# Altium footprint library Intelliclone.PcbLib: 372 footprints (part 6 of 24)
Each footprint in its own frame and in the unit in brackets; x right, y up, seen from the top. Pads: shape width x height; smd on the part's side, far side on the other; paste and mask are expansions set on the pad; w line width, h text height; cw(c..) or ccw(c..) is an arc to the next point about the centre after c.
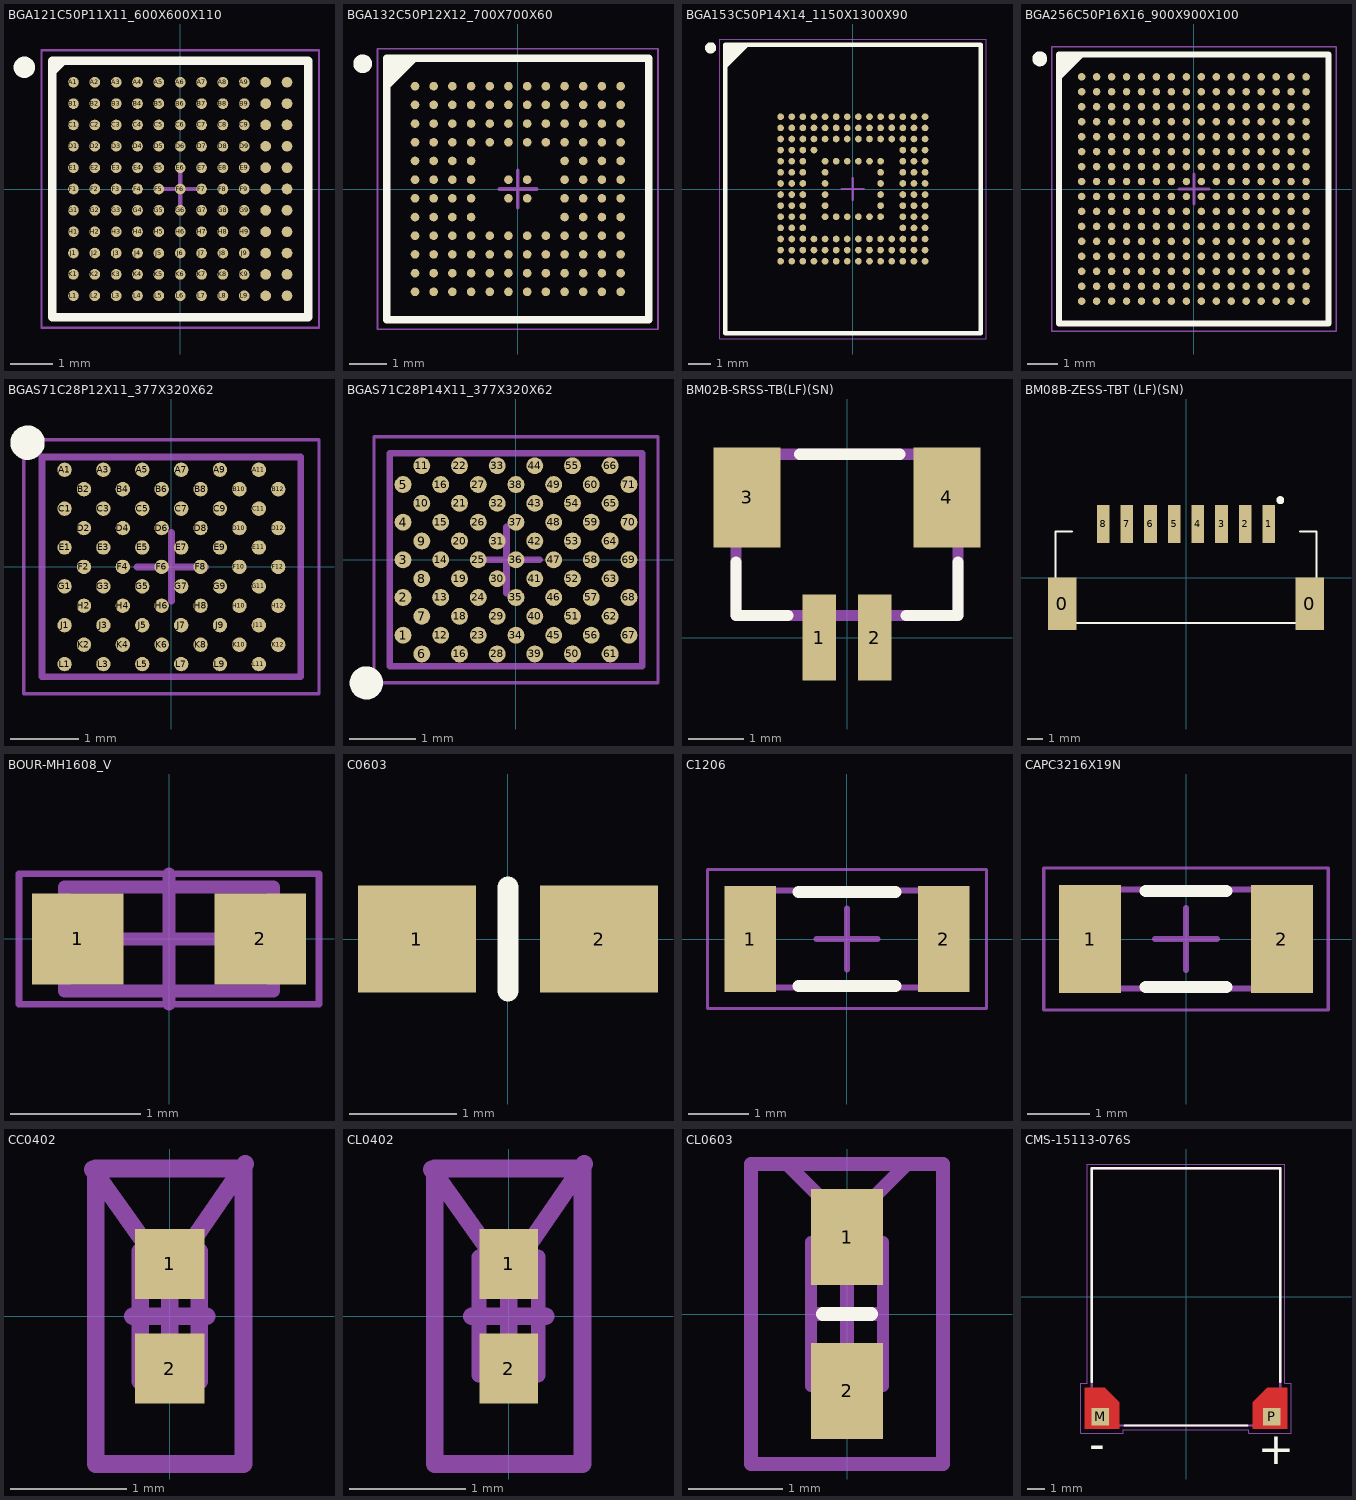
[diagram p5: the footprints below, top view; thin cyan lines are the x and y axes]

## BGA121C50P11X11_600X600X110 [mm] "BGA, 121-Leads, Body 6.00x6.00mmx1.10mm, Pitch 0.50mm"
height 1.1
pads (121):
  round 0.25 smd: A1(-2.5,2.5) A2(-2,2.5) A3(-1.5,2.5) A4(-1,2.5) A5(-0.5,2.5) A6(0,2.5) A7(0.5,2.5) A8(1,2.5) A9(1.5,2.5) A10(2,2.5) A11(2.5,2.5) B1(-2.5,2) B2(-2,2) B3(-1.5,2) B4(-1,2) B5(-0.5,2) B6(0,2) B7(0.5,2) B8(1,2) B9(1.5,2) B10(2,2) B11(2.5,2) C1(-2.5,1.5) C2(-2,1.5) C3(-1.5,1.5) C4(-1,1.5) C5(-0.5,1.5) C6(0,1.5) C7(0.5,1.5) C8(1,1.5) C9(1.5,1.5) C10(2,1.5) C11(2.5,1.5) D1(-2.5,1) D2(-2,1) D3(-1.5,1) D4(-1,1) D5(-0.5,1) D6(0,1) D7(0.5,1) D8(1,1) D9(1.5,1) D10(2,1) D11(2.5,1) E1(-2.5,0.5) E2(-2,0.5) E3(-1.5,0.5) E4(-1,0.5) E5(-0.5,0.5) E6(0,0.5) E7(0.5,0.5) E8(1,0.5) E9(1.5,0.5) E10(2,0.5) E11(2.5,0.5) F1(-2.5,0) F2(-2,0) F3(-1.5,0) F4(-1,0) F5(-0.5,0) F6(0,0) F7(0.5,0) F8(1,0) F9(1.5,0) F10(2,0) F11(2.5,0) G1(-2.5,-0.5) G2(-2,-0.5) G3(-1.5,-0.5) G4(-1,-0.5) G5(-0.5,-0.5) G6(0,-0.5) G7(0.5,-0.5) G8(1,-0.5) G9(1.5,-0.5) G10(2,-0.5) G11(2.5,-0.5) H1(-2.5,-1) H2(-2,-1) H3(-1.5,-1) H4(-1,-1) H5(-0.5,-1) H6(0,-1) H7(0.5,-1) H8(1,-1) H9(1.5,-1) H10(2,-1) H11(2.5,-1) J1(-2.5,-1.5) J2(-2,-1.5) J3(-1.5,-1.5) J4(-1,-1.5) J5(-0.5,-1.5) J6(0,-1.5) J7(0.5,-1.5) J8(1,-1.5) J9(1.5,-1.5) J10(2,-1.5) J11(2.5,-1.5) K1(-2.5,-2) K2(-2,-2) K3(-1.5,-2) K4(-1,-2) K5(-0.5,-2) K6(0,-2) K7(0.5,-2) K8(1,-2) K9(1.5,-2) K10(2,-2) K11(2.5,-2) L1(-2.5,-2.5) L2(-2,-2.5) L3(-1.5,-2.5) L4(-1,-2.5) L5(-0.5,-2.5) L6(0,-2.5) L7(0.5,-2.5) L8(1,-2.5) L9(1.5,-2.5) L10(2,-2.5) L11(2.5,-2.5)
Top Overlay:
  circle w0.25: c-3.65,2.85 r0.125
  region: -2.742,3 -3,2.742 -3,3
  lines w0.2: -3,2.742 -2.742,3 ; -3,-3 3,-3 3,3 -3,3 -3,-3
Mechanical 13:
  lines w0.1: -3,-3 3,-3 3,3 -3,3 -3,-3
Mechanical 15:
  lines w0.05: -3.25,-3.25 3.25,-3.25 3.25,3.25 -3.25,3.25 -3.25,-3.25
  lines w0.1: -0.5,0 0.5,0 ; 0,-0.5 0,0.5
3D body "BGA121C50P11X11_600X600X110.step": height 1.1, standoff 0, extent -3,-3 3,3

## BGA132C50P12X12_700X700X60 [mm] "BGA, 132-Leads, Body 7.00x7.00mmx0.60mm, Pitch 0.50mm"
height 0.6
pads (132):
  round 0.23 smd: A1(-2.75,2.75) A2(-2.25,2.75) A3(-1.75,2.75) A4(-1.25,2.75) A5(-0.75,2.75) A6(-0.25,2.75) A7(0.25,2.75) A8(0.75,2.75) A9(1.25,2.75) A10(1.75,2.75) A11(2.25,2.75) A12(2.75,2.75) B1(-2.75,2.25) B2(-2.25,2.25) B3(-1.75,2.25) B4(-1.25,2.25) B5(-0.75,2.25) B6(-0.25,2.25) B7(0.25,2.25) B8(0.75,2.25) B9(1.25,2.25) B10(1.75,2.25) B11(2.25,2.25) B12(2.75,2.25) C1(-2.75,1.75) C2(-2.25,1.75) C3(-1.75,1.75) C4(-1.25,1.75) C5(-0.75,1.75) C6(-0.25,1.75) C7(0.25,1.75) C8(0.75,1.75) C9(1.25,1.75) C10(1.75,1.75) C11(2.25,1.75) C12(2.75,1.75) D1(-2.75,1.25) D2(-2.25,1.25) D3(-1.75,1.25) D4(-1.25,1.25) D5(-0.75,1.25) D6(-0.25,1.25) D7(0.25,1.25) D8(0.75,1.25) D9(1.25,1.25) D10(1.75,1.25) D11(2.25,1.25) D12(2.75,1.25) E1(-2.75,0.75) E2(-2.25,0.75) E3(-1.75,0.75) E4(-1.25,0.75) E9(1.25,0.75) E10(1.75,0.75) E11(2.25,0.75) E12(2.75,0.75) F1(-2.75,0.25) F2(-2.25,0.25) F3(-1.75,0.25) F4(-1.25,0.25) F6(-0.25,0.25) F7(0.25,0.25) F9(1.25,0.25) F10(1.75,0.25) F11(2.25,0.25) F12(2.75,0.25) G1(-2.75,-0.25) G2(-2.25,-0.25) G3(-1.75,-0.25) G4(-1.25,-0.25) G6(-0.25,-0.25) G7(0.25,-0.25) G9(1.25,-0.25) G10(1.75,-0.25) G11(2.25,-0.25) G12(2.75,-0.25) H1(-2.75,-0.75) H2(-2.25,-0.75) H3(-1.75,-0.75) H4(-1.25,-0.75) H9(1.25,-0.75) H10(1.75,-0.75) H11(2.25,-0.75) H12(2.75,-0.75) J1(-2.75,-1.25) J2(-2.25,-1.25) J3(-1.75,-1.25) J4(-1.25,-1.25) J5(-0.75,-1.25) J6(-0.25,-1.25) J7(0.25,-1.25) J8(0.75,-1.25) J9(1.25,-1.25) J10(1.75,-1.25) J11(2.25,-1.25) J12(2.75,-1.25) K1(-2.75,-1.75) K2(-2.25,-1.75) K3(-1.75,-1.75) K4(-1.25,-1.75) K5(-0.75,-1.75) K6(-0.25,-1.75) K7(0.25,-1.75) K8(0.75,-1.75) K9(1.25,-1.75) K10(1.75,-1.75) K11(2.25,-1.75) K12(2.75,-1.75) L1(-2.75,-2.25) L2(-2.25,-2.25) L3(-1.75,-2.25) L4(-1.25,-2.25) L5(-0.75,-2.25) L6(-0.25,-2.25) L7(0.25,-2.25) L8(0.75,-2.25) L9(1.25,-2.25) L10(1.75,-2.25) L11(2.25,-2.25) L12(2.75,-2.25) M1(-2.75,-2.75) M2(-2.25,-2.75) M3(-1.75,-2.75) M4(-1.25,-2.75) M5(-0.75,-2.75) M6(-0.25,-2.75) M7(0.25,-2.75) M8(0.75,-2.75) M9(1.25,-2.75) M10(1.75,-2.75) M11(2.25,-2.75) M12(2.75,-2.75)
Top Overlay:
  circle w0.25: c-4.15,3.35 r0.125
  region: -2.764,3.5 -3.5,2.764 -3.5,3.5
  lines w0.2: -3.5,2.764 -2.764,3.5 ; -3.5,-3.5 3.5,-3.5 3.5,3.5 -3.5,3.5 -3.5,-3.5
Mechanical 13:
  lines w0.1: -3.5,-3.5 3.5,-3.5 3.5,3.5 -3.5,3.5 -3.5,-3.5
Mechanical 15:
  lines w0.05: -3.75,-3.75 3.75,-3.75 3.75,3.75 -3.75,3.75 -3.75,-3.75
  lines w0.1: -0.5,0 0.5,0 ; 0,-0.5 0,0.5
3D body "BGA132C50P12X12_700X700X60.step": height 0.6, standoff 0, extent -3.5,-3.5 3.5,3.5

## BGA153C50P14X14_1150X1300X90 [mm] "BGA, 153-Leads, Body 11.50x13.00mmx0.90mm, Pitch 0.50mm"
height 0.9
pads (153):
  round 0.3 smd: A1(-3.25,3.25) A2(-2.75,3.25) A3(-2.25,3.25) A4(-1.75,3.25) A5(-1.25,3.25) A6(-0.75,3.25) A7(-0.25,3.25) A8(0.25,3.25) A9(0.75,3.25) A10(1.25,3.25) A11(1.75,3.25) A12(2.25,3.25) A13(2.75,3.25) A14(3.25,3.25) B1(-3.25,2.75) B2(-2.75,2.75) B3(-2.25,2.75) B4(-1.75,2.75) B5(-1.25,2.75) B6(-0.75,2.75) B7(-0.25,2.75) B8(0.25,2.75) B9(0.75,2.75) B10(1.25,2.75) B11(1.75,2.75) B12(2.25,2.75) B13(2.75,2.75) B14(3.25,2.75) C1(-3.25,2.25) C2(-2.75,2.25) C3(-2.25,2.25) C4(-1.75,2.25) C5(-1.25,2.25) C6(-0.75,2.25) C7(-0.25,2.25) C8(0.25,2.25) C9(0.75,2.25) C10(1.25,2.25) C11(1.75,2.25) C12(2.25,2.25) C13(2.75,2.25) C14(3.25,2.25) D1(-3.25,1.75) D2(-2.75,1.75) D3(-2.25,1.75) D4(-1.75,1.75) D12(2.25,1.75) D13(2.75,1.75) D14(3.25,1.75) E1(-3.25,1.25) E2(-2.75,1.25) E3(-2.25,1.25) E5(-1.25,1.25) E6(-0.75,1.25) E7(-0.25,1.25) E8(0.25,1.25) E9(0.75,1.25) E10(1.25,1.25) E12(2.25,1.25) E13(2.75,1.25) E14(3.25,1.25) F1(-3.25,0.75) F2(-2.75,0.75) F3(-2.25,0.75) F5(-1.25,0.75) F10(1.25,0.75) F12(2.25,0.75) F13(2.75,0.75) F14(3.25,0.75) G1(-3.25,0.25) G2(-2.75,0.25) G3(-2.25,0.25) G5(-1.25,0.25) G10(1.25,0.25) G12(2.25,0.25) G13(2.75,0.25) G14(3.25,0.25) H1(-3.25,-0.25) H2(-2.75,-0.25) H3(-2.25,-0.25) H5(-1.25,-0.25) H10(1.25,-0.25) H12(2.25,-0.25) H13(2.75,-0.25) H14(3.25,-0.25) J1(-3.25,-0.75) J2(-2.75,-0.75) J3(-2.25,-0.75) J5(-1.25,-0.75) J10(1.25,-0.75) J12(2.25,-0.75) J13(2.75,-0.75) J14(3.25,-0.75) K1(-3.25,-1.25) K2(-2.75,-1.25) K3(-2.25,-1.25) K5(-1.25,-1.25) K6(-0.75,-1.25) K7(-0.25,-1.25) K8(0.25,-1.25) K9(0.75,-1.25) K10(1.25,-1.25) K12(2.25,-1.25) K13(2.75,-1.25) K14(3.25,-1.25) L1(-3.25,-1.75) L2(-2.75,-1.75) L3(-2.25,-1.75) L12(2.25,-1.75) L13(2.75,-1.75) L14(3.25,-1.75) M1(-3.25,-2.25) M2(-2.75,-2.25) M3(-2.25,-2.25) M4(-1.75,-2.25) M5(-1.25,-2.25) M6(-0.75,-2.25) M7(-0.25,-2.25) M8(0.25,-2.25) M9(0.75,-2.25) M10(1.25,-2.25) M11(1.75,-2.25) M12(2.25,-2.25) M13(2.75,-2.25) M14(3.25,-2.25) N1(-3.25,-2.75) N2(-2.75,-2.75) N3(-2.25,-2.75) N4(-1.75,-2.75) N5(-1.25,-2.75) N6(-0.75,-2.75) N7(-0.25,-2.75) N8(0.25,-2.75) N9(0.75,-2.75) N10(1.25,-2.75) N11(1.75,-2.75) N12(2.25,-2.75) N13(2.75,-2.75) N14(3.25,-2.75) P1(-3.25,-3.25) P2(-2.75,-3.25) P3(-2.25,-3.25) P4(-1.75,-3.25) P5(-1.25,-3.25) P6(-0.75,-3.25) P7(-0.25,-3.25) P8(0.25,-3.25) P9(0.75,-3.25) P10(1.25,-3.25) P11(1.75,-3.25) P12(2.25,-3.25) P13(2.75,-3.25) P14(3.25,-3.25)
Top Overlay:
  circle w0.25: c-6.4,6.35 r0.125
  region: -4.75,6.5 -5.75,5.5 -5.75,6.5
  lines w0.2: -5.75,5.5 -4.75,6.5 ; -5.75,-6.5 5.75,-6.5 5.75,6.5 -5.75,6.5 -5.75,-6.5
Mechanical 13:
  lines w0.1: -5.75,-6.5 5.75,-6.5 5.75,6.5 -5.75,6.5 -5.75,-6.5
Mechanical 15:
  lines w0.05: -6,-6.75 6,-6.75 6,6.75 -6,6.75 -6,-6.75
  lines w0.1: -0.5,0 0.5,0 ; 0,-0.5 0,0.5
3D body: height 0.9, standoff 0.16, extent -5.75,-6.5 5.75,6.5

## BGA256C50P16X16_900X900X100 [mm] "BGA, 256-Leads, Body 9.00x9.00mmx1.00mm, Pitch 0.50mm"
height 1
pads (256):
  round 0.25 smd: A1(-3.75,3.75) A2(-3.25,3.75) A3(-2.75,3.75) A4(-2.25,3.75) A5(-1.75,3.75) A6(-1.25,3.75) A7(-0.75,3.75) A8(-0.25,3.75) A9(0.25,3.75) A10(0.75,3.75) A11(1.25,3.75) A12(1.75,3.75) A13(2.25,3.75) A14(2.75,3.75) A15(3.25,3.75) A16(3.75,3.75) B1(-3.75,3.25) B2(-3.25,3.25) B3(-2.75,3.25) B4(-2.25,3.25) B5(-1.75,3.25) B6(-1.25,3.25) B7(-0.75,3.25) B8(-0.25,3.25) B9(0.25,3.25) B10(0.75,3.25) B11(1.25,3.25) B12(1.75,3.25) B13(2.25,3.25) B14(2.75,3.25) B15(3.25,3.25) B16(3.75,3.25) C1(-3.75,2.75) C2(-3.25,2.75) C3(-2.75,2.75) C4(-2.25,2.75) C5(-1.75,2.75) C6(-1.25,2.75) C7(-0.75,2.75) C8(-0.25,2.75) C9(0.25,2.75) C10(0.75,2.75) C11(1.25,2.75) C12(1.75,2.75) C13(2.25,2.75) C14(2.75,2.75) C15(3.25,2.75) C16(3.75,2.75) D1(-3.75,2.25) D2(-3.25,2.25) D3(-2.75,2.25) D4(-2.25,2.25) D5(-1.75,2.25) D6(-1.25,2.25) D7(-0.75,2.25) D8(-0.25,2.25) D9(0.25,2.25) D10(0.75,2.25) D11(1.25,2.25) D12(1.75,2.25) D13(2.25,2.25) D14(2.75,2.25) D15(3.25,2.25) D16(3.75,2.25) E1(-3.75,1.75) E2(-3.25,1.75) E3(-2.75,1.75) E4(-2.25,1.75) E5(-1.75,1.75) E6(-1.25,1.75) E7(-0.75,1.75) E8(-0.25,1.75) E9(0.25,1.75) E10(0.75,1.75) E11(1.25,1.75) E12(1.75,1.75) E13(2.25,1.75) E14(2.75,1.75) E15(3.25,1.75) E16(3.75,1.75) F1(-3.75,1.25) F2(-3.25,1.25) F3(-2.75,1.25) F4(-2.25,1.25) F5(-1.75,1.25) F6(-1.25,1.25) F7(-0.75,1.25) F8(-0.25,1.25) F9(0.25,1.25) F10(0.75,1.25) F11(1.25,1.25) F12(1.75,1.25) F13(2.25,1.25) F14(2.75,1.25) F15(3.25,1.25) F16(3.75,1.25) G1(-3.75,0.75) G2(-3.25,0.75) G3(-2.75,0.75) G4(-2.25,0.75) G5(-1.75,0.75) G6(-1.25,0.75) G7(-0.75,0.75) G8(-0.25,0.75) G9(0.25,0.75) G10(0.75,0.75) G11(1.25,0.75) G12(1.75,0.75) G13(2.25,0.75) G14(2.75,0.75) G15(3.25,0.75) G16(3.75,0.75) H1(-3.75,0.25) H2(-3.25,0.25) H3(-2.75,0.25) H4(-2.25,0.25) H5(-1.75,0.25) H6(-1.25,0.25) H7(-0.75,0.25) H8(-0.25,0.25) H9(0.25,0.25) H10(0.75,0.25) H11(1.25,0.25) H12(1.75,0.25) H13(2.25,0.25) H14(2.75,0.25) H15(3.25,0.25) H16(3.75,0.25) J1(-3.75,-0.25) J2(-3.25,-0.25) J3(-2.75,-0.25) J4(-2.25,-0.25) J5(-1.75,-0.25) J6(-1.25,-0.25) J7(-0.75,-0.25) J8(-0.25,-0.25) J9(0.25,-0.25) J10(0.75,-0.25) J11(1.25,-0.25) J12(1.75,-0.25) J13(2.25,-0.25) J14(2.75,-0.25) J15(3.25,-0.25) J16(3.75,-0.25) K1(-3.75,-0.75) K2(-3.25,-0.75) K3(-2.75,-0.75) K4(-2.25,-0.75) K5(-1.75,-0.75) K6(-1.25,-0.75) K7(-0.75,-0.75) K8(-0.25,-0.75) K9(0.25,-0.75) K10(0.75,-0.75) K11(1.25,-0.75) K12(1.75,-0.75) K13(2.25,-0.75) K14(2.75,-0.75) K15(3.25,-0.75) K16(3.75,-0.75) L1(-3.75,-1.25) L2(-3.25,-1.25) L3(-2.75,-1.25) L4(-2.25,-1.25) L5(-1.75,-1.25) L6(-1.25,-1.25) L7(-0.75,-1.25) L8(-0.25,-1.25) L9(0.25,-1.25) L10(0.75,-1.25) L11(1.25,-1.25) L12(1.75,-1.25) L13(2.25,-1.25) L14(2.75,-1.25) L15(3.25,-1.25) L16(3.75,-1.25) M1(-3.75,-1.75) M2(-3.25,-1.75) M3(-2.75,-1.75) M4(-2.25,-1.75) M5(-1.75,-1.75) M6(-1.25,-1.75) M7(-0.75,-1.75) M8(-0.25,-1.75) M9(0.25,-1.75) M10(0.75,-1.75) M11(1.25,-1.75) M12(1.75,-1.75) M13(2.25,-1.75) M14(2.75,-1.75) M15(3.25,-1.75) M16(3.75,-1.75) N1(-3.75,-2.25) N2(-3.25,-2.25) N3(-2.75,-2.25) N4(-2.25,-2.25) N5(-1.75,-2.25) N6(-1.25,-2.25) N7(-0.75,-2.25) N8(-0.25,-2.25) N9(0.25,-2.25) N10(0.75,-2.25) N11(1.25,-2.25) N12(1.75,-2.25) N13(2.25,-2.25) N14(2.75,-2.25) N15(3.25,-2.25) N16(3.75,-2.25) P1(-3.75,-2.75) P2(-3.25,-2.75) P3(-2.75,-2.75) P4(-2.25,-2.75) P5(-1.75,-2.75) P6(-1.25,-2.75) P7(-0.75,-2.75) P8(-0.25,-2.75) P9(0.25,-2.75) P10(0.75,-2.75) P11(1.25,-2.75) P12(1.75,-2.75) P13(2.25,-2.75) P14(2.75,-2.75) P15(3.25,-2.75) P16(3.75,-2.75) R1(-3.75,-3.25) R2(-3.25,-3.25) R3(-2.75,-3.25) R4(-2.25,-3.25) R5(-1.75,-3.25) R6(-1.25,-3.25) R7(-0.75,-3.25) R8(-0.25,-3.25) R9(0.25,-3.25) R10(0.75,-3.25) R11(1.25,-3.25) R12(1.75,-3.25) R13(2.25,-3.25) R14(2.75,-3.25) R15(3.25,-3.25) R16(3.75,-3.25) T1(-3.75,-3.75) T2(-3.25,-3.75) T3(-2.75,-3.75) T4(-2.25,-3.75) T5(-1.75,-3.75) T6(-1.25,-3.75) T7(-0.75,-3.75) T8(-0.25,-3.75) T9(0.25,-3.75) T10(0.75,-3.75) T11(1.25,-3.75) T12(1.75,-3.75) T13(2.25,-3.75) T14(2.75,-3.75) T15(3.25,-3.75) T16(3.75,-3.75)
Top Overlay:
  circle w0.25: c-5.15,4.35 r0.125
  region: -3.742,4.5 -4.5,3.742 -4.5,4.5
  lines w0.2: -4.5,3.742 -3.742,4.5 ; -4.5,-4.5 4.5,-4.5 4.5,4.5 -4.5,4.5 -4.5,-4.5
Mechanical 13:
  lines w0.1: -4.5,-4.5 4.5,-4.5 4.5,4.5 -4.5,4.5 -4.5,-4.5
Mechanical 15:
  lines w0.05: -4.75,-4.75 4.75,-4.75 4.75,4.75 -4.75,4.75 -4.75,-4.75
  lines w0.1: -0.5,0 0.5,0 ; 0,-0.5 0,0.5
3D body "BGA256C50P16X16_900X900X100.step": height 1, standoff 0, extent -4.5,-4.5 4.5,4.5

## BGAS71C28P12X11_377X320X62 [mm] "BGA, 71-Leads, Body 3.77x3.20mmx0.63mm, Pitch 0.28mm"
height 0.63
pads (66):
  round 0.21 smd: A1(-1.556,1.415) A3(-0.99,1.415) A5(-0.425,1.415) A7(0.142,1.415) A9(0.708,1.415) A11(1.274,1.415) B2(-1.274,1.132) B4(-0.707,1.132) B6(-0.141,1.132) B8(0.425,1.132) B10(0.991,1.132) B12(1.557,1.132) C1(-1.556,0.849) C3(-0.99,0.849) C5(-0.425,0.849) C7(0.142,0.849) C9(0.708,0.849) C11(1.274,0.849) D2(-1.274,0.566) D4(-0.707,0.566) D6(-0.141,0.566) D8(0.425,0.566) D10(0.991,0.566) D12(1.557,0.566) E1(-1.556,0.283) E3(-0.99,0.283) E5(-0.425,0.283) E7(0.142,0.283) E9(0.708,0.283) E11(1.274,0.283) F2(-1.274,0) F4(-0.707,0) F6(-0.141,0) F8(0.425,0) F10(0.991,0) F12(1.557,0) G1(-1.556,-0.283) G3(-0.99,-0.283) G5(-0.425,-0.283) G7(0.142,-0.283) G9(0.708,-0.283) G11(1.274,-0.283) H2(-1.274,-0.566) H4(-0.707,-0.566) H6(-0.141,-0.566) H8(0.425,-0.566) H10(0.991,-0.566) H12(1.557,-0.566) J1(-1.556,-0.849) J3(-0.99,-0.849) J5(-0.425,-0.849) J7(0.142,-0.849) J9(0.708,-0.849) J11(1.274,-0.849) K2(-1.274,-1.132) K4(-0.707,-1.132) K6(-0.141,-1.132) K8(0.425,-1.132) K10(0.991,-1.132) K12(1.557,-1.132) L1(-1.556,-1.415) L3(-0.99,-1.415) L5(-0.425,-1.415) L7(0.142,-1.415) L9(0.708,-1.415) L11(1.274,-1.415)
Top Overlay:
  circle w0.25: c-2.095,1.81 r0.125
Mechanical 13:
  lines w0.1: -1.885,-1.6 -1.885,1.6 1.885,1.6 1.885,-1.6 -1.885,-1.6
Mechanical 15:
  lines w0.05: -2.15,-1.85 -2.15,1.85 2.15,1.85 2.15,-1.85 -2.15,-1.85
  lines w0.1: -0.5,0 0.5,0 ; 0,-0.5 0,0.5
3D body: height 0.63, standoff 0.2, extent -1.885,-1.6 1.885,1.6

## BGAS71C28P14X11_377X320X62 [mil] "BGA, 71-Leads, Body 3.77x3.20mmx0.63mm, Pitch 0.28mm"
height 24.8
pads (71):
  round 10 smd mask-0.4: 1(-66.85,-44.57) 2(-66.85,-22.28) 3(-66.85,0) 4(-66.85,22.28) 5(-66.85,44.57) 6(-55.71,-55.71) 7(-55.71,-33.43) 8(-55.71,-11.14) 9(-55.71,11.14) 10(-55.71,33.43) 11(-55.71,55.71) 12(-44.57,-44.57) 13(-44.57,-22.28) 14(-44.57,0) 15(-44.57,22.28) 16(-44.57,44.57) 16(-33.43,-55.71) 18(-33.43,-33.43) 19(-33.43,-11.14) 20(-33.43,11.14) 21(-33.43,33.43) 22(-33.43,55.71) 23(-22.28,-44.57) 24(-22.28,-22.28) 25(-22.28,0) 26(-22.28,22.28) 27(-22.28,44.57) 28(-11.14,-55.71) 29(-11.14,-33.43) 30(-11.14,-11.14) 31(-11.14,11.14) 32(-11.14,33.43) 33(-11.14,55.71) 34(0,-44.57) 35(0,-22.28) 36(0,0) 37(0,22.28) 38(0,44.57) 39(11.14,-55.71) 40(11.14,-33.43) 41(11.14,-11.14) 42(11.14,11.14) 43(11.14,33.43) 44(11.14,55.71) 45(22.28,-44.57) 46(22.28,-22.28) 47(22.28,0) 48(22.28,22.28) 49(22.28,44.57) 50(33.43,-55.71) 51(33.43,-33.43) 52(33.43,-11.14) 53(33.43,11.14) 54(33.43,33.43) 55(33.43,55.71) 56(44.57,-44.57) 57(44.57,-22.28) 58(44.57,0) 59(44.57,22.28) 60(44.57,44.57) 61(55.71,-55.71) 62(55.71,-33.43) 63(55.71,-11.14) 64(55.71,11.14) 65(55.71,33.43) 66(55.71,55.71) 67(66.85,-44.57) 68(66.85,-22.28) 69(66.85,0) 70(66.85,22.28) 71(66.85,44.57)
Top Overlay:
  circle w9.84: c-88.58,-72.83 r4.92
Mechanical 13:
  lines w3.94: -74.8,-62.99 74.8,-62.99 74.8,62.99 -74.8,62.99 -74.8,-62.99
Mechanical 15:
  lines w1.97: -84.06,-72.83 84.06,-72.83 84.06,72.83 -84.06,72.83 -84.06,-72.83
  lines w3.94: -25.26,0 14.11,0 ; -5.57,-19.68 -5.57,19.69
3D body: height 24.8, standoff 7.87, extent -74,-62.98 74.43,63

## BM02B-SRSS-TB(LF)(SN) [mm] "Solar connecotr"
pads (4):
  rect 0.6x1.55 smd: 1(-0.5,0) 2(0.5,0)
  rect 1.2x1.8 smd: 3(-1.8,2.525) 4(1.8,2.525)
Top Overlay:
  lines w0.2: -2,1.359 -2,0.4 -1.062,0.4 ; -0.85,3.3 0.95,3.3 ; 1.062,0.4 2,0.4 2,1.359
Mechanical 15:
  lines w0.2: -2,0.4 2,0.4 2,3.3 -2,3.3 -2,0.4
3D body "BM02B-SRSS-TB.STEP": height 4.25, standoff -0.07, extent -2,-0.37 2,3.23

## BM08B-ZESS-TBT (LF)(SN) [mil]
height 209.84
pads (10):
  rect 70.87x129.92 smd: 0(-309.05,-65.43) 0(309.05,-65.43)
  rect 31.5x94.5 smd: 1(206.69,133.92) 2(147.64,133.92) 3(88.58,133.92) 4(29.53,133.92) 5(-29.53,133.92) 6(-88.58,133.92) 7(-147.64,133.92) 8(-206.69,133.92)
Top Overlay:
  circle w9.84: c235.08,193 r4.92
  lines w5: -283.84,114.44 -324.8,114.44 -324.8,-113.91 324.8,-113.91 324.8,114.44 283.84,114.44
3D body: height 296, standoff 4, extent -325.2,-114 325,114

## BOUR-MH1608_V [mm] "Chip Bead, 2-Leads, Body 1.6x0.8mm"
height 1
pads (2):
  rect 0.7x0.7 smd: 1(-0.7,0) 2(0.7,0)
Mechanical 13:
  lines w0.1: -0.8,-0.4 0.8,-0.4 0.8,0.4 -0.8,0.4 -0.8,-0.4
Mechanical 15:
  lines w0.05: -1.15,-0.5 -1.15,0.5 1.15,0.5 1.15,-0.5 -1.15,-0.5
  lines w0.1: -0.5,0 0.5,0 ; 0,-0.5 0,0.5
3D body "mh1608.stp": height 0.8, standoff 0, extent -0.8,-0.381 0.8,0.419

## C0603 [mm] "Chip Capacitor; Body 1.6 x 0.8 mm (LxW typ)"
height 0.87
pads (2):
  rect 1.1x1 smd: 1(-0.85,0) 2(0.85,0)
Top Overlay:
  lines w0.2: 0,-0.483 0,0.483
3D body "SW3dPS-0603 SMD Capacitor.step": height 0.3, standoff 0, extent -0.75,-0.4 0.85,0.4

## C1206 [mm] "Chip Capacitor, 2-Leads, Body 3.20x1.60mm, IPC Medium Density"
height 1.6
pads (2):
  rect 0.85x1.75 smd: 1(-1.6,0) 2(1.6,0)
Top Overlay:
  lines w0.2: -0.8,-0.775 0.8,-0.775 ; -0.8,0.775 0.8,0.775
Mechanical 13:
  lines w0.1: -1.6,-0.8 1.6,-0.8 1.6,0.8 -1.6,0.8 -1.6,-0.8
Mechanical 15:
  lines w0.05: -2.3,-1.15 2.3,-1.15 2.3,1.15 -2.3,1.15 -2.3,-1.15
  lines w0.1: -0.5,0 0.5,0 ; 0,-0.5 0,0.5
3D body "CAPC3216X16N.step": height 1.6, standoff 0, extent -1.6,-0.8 1.6,0.8

## CAPC3216X19N [mm] "Chip Capacitor, 2-Leads, Body 3.20x1.60mm, IPC Medium Density"
height 1.9
pads (2):
  rect 1x1.75 smd: 1(-1.55,0) 2(1.55,0)
Top Overlay:
  lines w0.2: -0.65,-0.775 0.65,-0.775 ; -0.65,0.775 0.65,0.775
Mechanical 13:
  lines w0.1: -1.6,-0.8 -1.6,0.8 1.6,0.8 1.6,-0.8 -1.6,-0.8
Mechanical 15:
  lines w0.05: -2.3,-1.15 -2.3,1.15 2.3,1.15 2.3,-1.15 -2.3,-1.15
  lines w0.1: -0.5,0 0.5,0 ; 0,-0.5 0,0.5
3D body: height 1.9, standoff 0, extent -1.22,-0.8 1.22,0.8
3D body: height 1.9, standoff 0, extent -1.6,-0.8 -1.22,0.8
3D body: height 1.9, standoff 0, extent 1.22,-0.8 1.6,0.8

## CC0402 [mm]
pads (2):
  rect 0.6x0.6 smd: 1(0,0.45) 2(0,-0.45)
Mechanical 13:
  lines w0.127: -0.254,-0.508 0.254,-0.508 0.254,0.508 -0.254,0.508 -0.254,-0.508
Mechanical 16:
  lines w0.15: -0.254,-0.559 0.254,-0.559 0.254,0.559 -0.254,0.559 -0.254,-0.559
  lines w0.152: -0.661,1.261 -0.011,0.347 0.65,1.309 ; -0.318,0 0.318,0 ; 0,-0.318 0,0.318 ; -0.635,-1.27 0.635,-1.27 0.635,1.27 -0.635,1.27 -0.635,-1.27
3D body: height 0.5, standoff 0, extent -0.254,-0.508 0.254,0.508

## CL0402 [mm]
pads (2):
  rect 0.5x0.6 smd: 1(0,0.45) 2(0,-0.45)
Mechanical 13:
  lines w0.127: -0.254,-0.508 0.254,-0.508 0.254,0.508 -0.254,0.508 -0.254,-0.508
Mechanical 16:
  lines w0.1: -0.254,-0.508 0.254,-0.508 0.254,0.508 -0.254,0.508 -0.254,-0.508
  lines w0.152: -0.661,1.261 -0.011,0.347 0.65,1.309 ; -0.318,0 0.318,0 ; 0,-0.318 0,0.318 ; -0.635,-1.27 0.635,-1.27 0.635,1.27 -0.635,1.27 -0.635,-1.27
3D body: height 0.5, standoff 0, extent -0.254,-0.508 0.254,0.508

## CL0603 [mil]
pads (2):
  rect 30x40 smd: 1(0,32) 2(0,-32)
Top Overlay:
  lines w6: -10,0 10,0
Mechanical 13:
  lines w5: -15,-30 -15,30 15,30 15,-30 -15,-30
Mechanical 16:
  lines w6: -25,62.5 0,37.5 25,62.5 ; -12.5,0 12.5,0 ; 0,-12.5 0,12.5 ; -40,-62.5 -40,62.5 40,62.5 40,-62.5 -40,-62.5
3D body: height 31.5, standoff 0, extent -15,-30 15,30

## CMS-15113-076S [mm] "SPEAKER, 15 X 11 MM, 3 MM DEEP"
height 3
pads (2):
  rect 1x1 smd: M(-5,-6.99) P(5,-6.99)
Top Layer:
  region: -5.9,-5.3 -4.74,-5.3 -3.9,-6.14 -3.9,-7.7 -5.9,-7.7
  region: 4.74,-5.3 5.9,-5.3 5.9,-7.7 3.9,-7.7 3.9,-6.14
Top Overlay:
  lines w0.127: -5.5,-4.95 -5.5,7.5 5.5,7.5 5.5,-4.95 ; -3.573,-7.5 3.573,-7.5
  text "-" at -5.65,-9.5 h1.88
  text "+" at 4.2,-9.75 h1.88
Top Paste:
  region: -5.9,-5.3 -4.74,-5.3 -3.9,-6.14 -3.9,-7.7 -5.9,-7.7
  region: 4.74,-5.3 5.9,-5.3 5.9,-7.7 3.9,-7.7 3.9,-6.14
Top Solder:
  region: -6,-5.2 -4.7,-5.2 -3.8,-6.1 -3.8,-7.8 -6,-7.8
  region: 4.7,-5.2 6,-5.2 6,-7.8 3.8,-7.8 3.8,-6.1
Mechanical 4:
  lines w0.127: -5.5,-7.5 -5.5,7.5 ; -5.5,-7.5 5.5,-7.5 ; -5.5,-7.5 -5.5,7.5 ; -5.5,-7.5 5.5,-7.5 ; -5.5,7.5 5.5,7.5 ; -5.5,7.5 5.5,7.5 ; 5.5,-7.5 5.5,7.5 ; 5.5,-7.5 5.5,7.5
Mechanical 15:
  lines w0.05: -6.15,-7.95 -6.15,-5.05 -5.75,-5.05 -5.75,7.75 5.75,7.75 5.75,-5.05 6.15,-5.05 6.15,-7.95 3.65,-7.95 3.65,-7.75 -3.65,-7.75 -3.65,-7.95 -6.15,-7.95
3D body "CUI_CMS-15113-076SP.step": height 3, standoff 0, extent -5.475,-7.45 5.525,7.55